# Altium footprint library MainFPs.PcbLib: 215 footprints (part 8 of 14)
Each footprint in its own frame and in the unit in brackets; x right, y up, seen from the top. Pads: shape width x height; smd on the part's side, far side on the other; paste and mask are expansions set on the pad; w line width, h text height; cw(c..) or ccw(c..) is an arc to the next point about the centre after c.
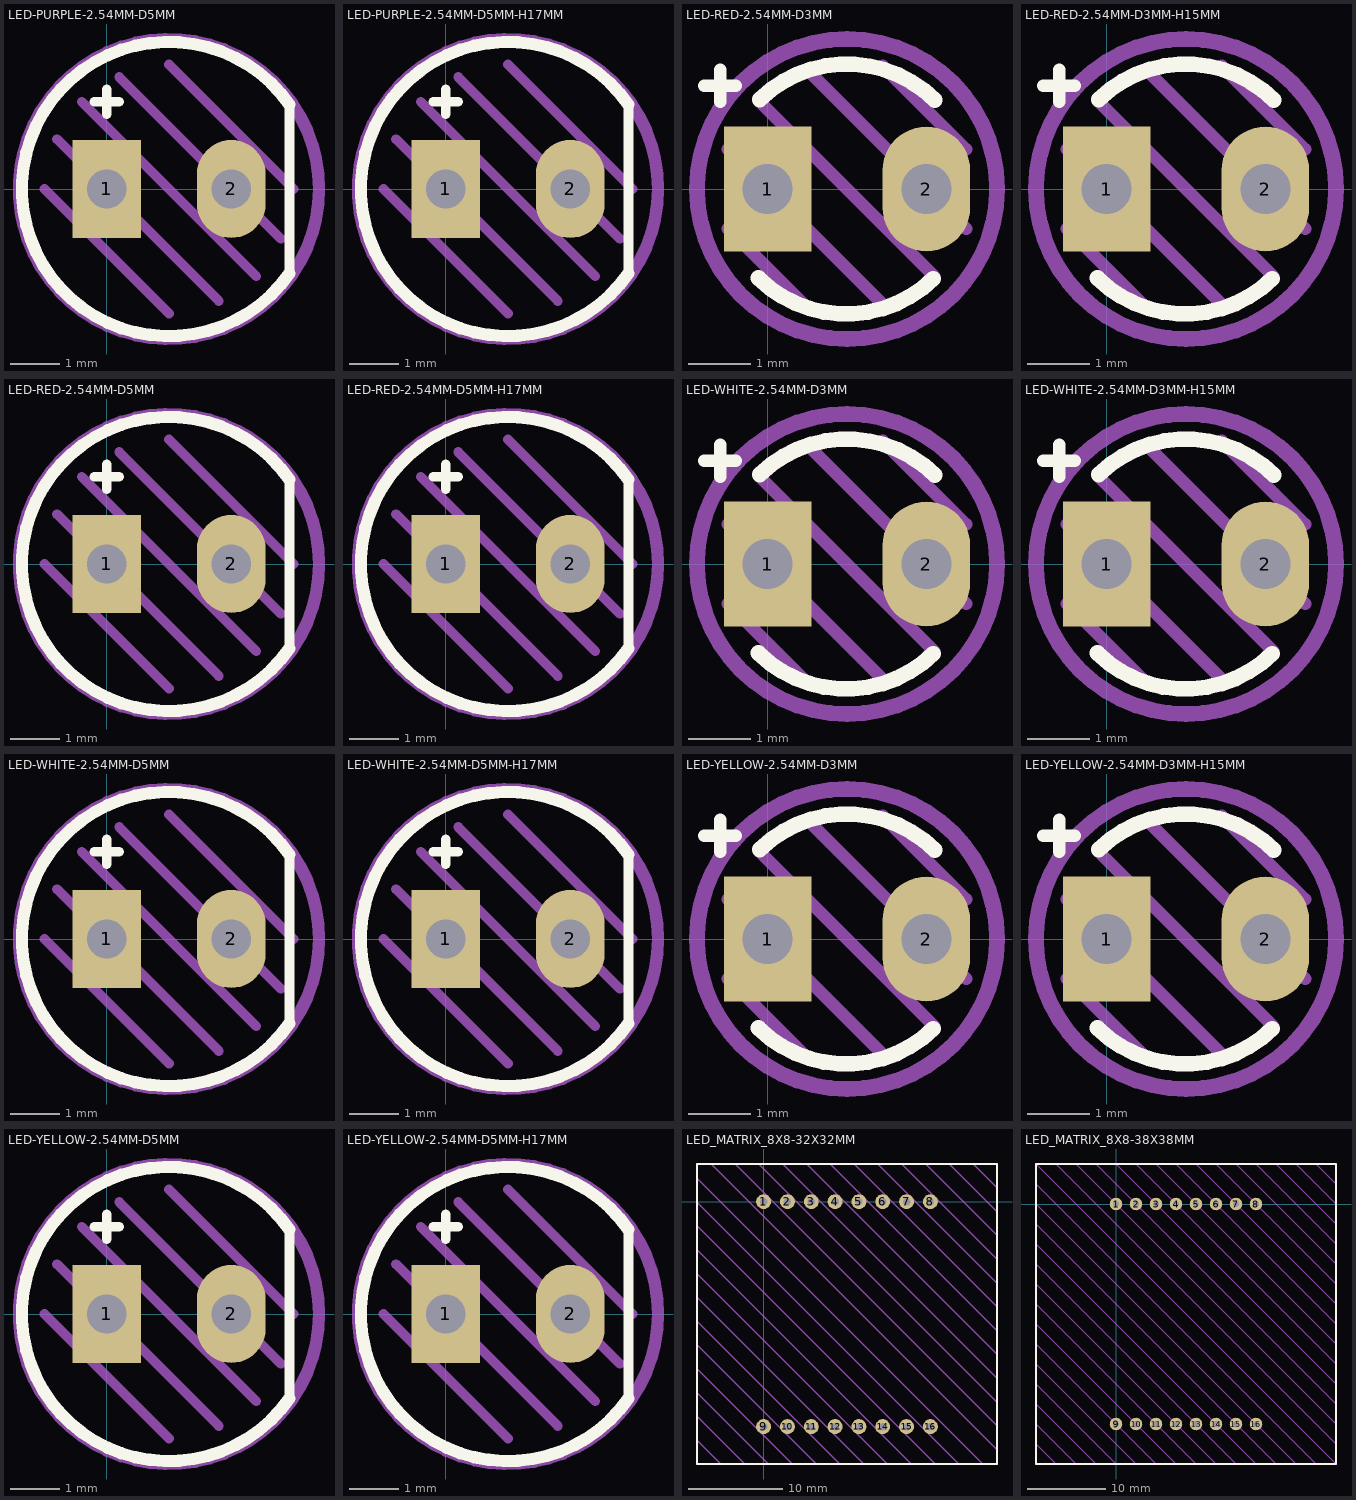
[diagram p7: the footprints below, top view; thin cyan lines are the x and y axes]

## LED-PURPLE-2.54MM-D5MM [mm]
pads (2):
  rect 1.4x2 hole 0.8: 1(0,0)
  oval 1.4x2 hole 0.8: 2(2.54,0)
Top Overlay:
  lines w0.2: -0.254,1.778 -0.127,1.778 0.127,1.778 0.254,1.778 ; 0,1.524 0,2.032 ; 3.727,-1.721 3.727,1.721
  lines w0.25: 3.727,-1.721 cw(c1.27,0) 3.727,1.721
Top Draw:
  circle w0.25: c1.27,0 r3.059
  lines w0.2: -1.27,0 1.27,-2.54 ; -1.016,1.016 2.286,-2.286 ; -0.508,1.778 3.048,-1.778 ; 0.254,2.286 3.556,-1.016 ; 1.27,2.54 3.81,0
Top Info:
  text "'.Comment'" at -1.578,-4.372 h1
3D body: height 1, standoff 0, extent -1.63,-2.909 3.77,2.909
3D body: height 7.7, standoff 2.7, extent -1.236,-2.5 3.764,2.5
3D body: height 5.2, standoff 1, extent -1.23,-2.5 3.77,2.5
3D body: height 0.5, standoff -3, extent 2.29,-0.25 2.79,0.25
3D body: height 0.5, standoff -3, extent -0.25,-0.25 0.25,0.25

## LED-PURPLE-2.54MM-D5MM-H17MM [mm]
pads (2):
  rect 1.4x2 hole 0.8: 1(0,0)
  oval 1.4x2 hole 0.8: 2(2.54,0)
Top Overlay:
  lines w0.2: -0.254,1.778 -0.127,1.778 0.127,1.778 0.254,1.778 ; 0,1.524 0,2.032 ; 3.727,-1.721 3.727,1.721
  lines w0.25: 3.727,-1.721 cw(c1.27,0) 3.727,1.721
Top Draw:
  circle w0.25: c1.27,0 r3.059
  lines w0.2: -1.27,0 1.27,-2.54 ; -1.016,1.016 2.286,-2.286 ; -0.508,1.778 3.048,-1.778 ; 0.254,2.286 3.556,-1.016 ; 1.27,2.54 3.81,0
Top Info:
  text "'.Comment'" at -1.578,-4.372 h1
3D body: height 10.3, standoff 9.3, extent -1.63,-2.909 3.77,2.909
3D body: height 17, standoff 12, extent -1.236,-2.5 3.764,2.5
3D body: height 14.5, standoff 10.3, extent -1.23,-2.5 3.77,2.5
3D body: height 7.8, standoff 7, extent 2.24,-0.25 2.84,0.25
3D body: height 7.8, standoff 7, extent -0.3,-0.25 0.3,0.25
3D body: height 10, standoff -3, extent -0.25,-0.25 0.25,0.25
3D body: height 10, standoff -3, extent 2.29,-0.25 2.79,0.25

## LED-RED-2.54MM-D3MM [mm]
pads (2):
  rect 1.4x2 hole 0.8: 1(0,0)
  oval 1.4x2 hole 0.8: 2(2.54,0)
Top Overlay:
  lines w0.2: -1.016,1.651 -0.508,1.651 ; -0.762,1.397 -0.762,1.905
  lines w0.25: -0.147,-1.425 ccw(c1.257,-0.001) 2.653,-1.434 ; -0.125,1.433 cw(c1.27,0) 2.674,1.424
Top Draw:
  circle w0.25: c1.27,0 r2.4
  lines w0.2: -0.635,-0.635 0.635,-1.905 ; -0.635,0.635 1.905,-1.905 ; -0.127,1.397 2.667,-1.397 ; 0.635,1.905 3.175,-0.635 ; 1.841,1.968 3.175,0.635
Top Info:
  text "'.Comment'" at -1.705,-3.61 h1
3D body: height 1, standoff 0, extent -0.63,-1.91 2.77,1.91
3D body: height 0.5, standoff -1.78, extent -0.25,-0.25 0.25,0.25
3D body: height 5.3, standoff 2.3, extent -0.236,-1.5 2.764,1.5
3D body: height 3.7, standoff 1, extent -0.23,-1.5 2.77,1.5
3D body: height 0.5, standoff -1.78, extent 2.29,-0.25 2.79,0.25

## LED-RED-2.54MM-D3MM-H15MM [mm]
pads (2):
  rect 1.4x2 hole 0.8: 1(0,0)
  oval 1.4x2 hole 0.8: 2(2.54,0)
Top Overlay:
  lines w0.2: -1.016,1.651 -0.508,1.651 ; -0.762,1.397 -0.762,1.905
  lines w0.25: -0.147,-1.425 ccw(c1.257,-0.001) 2.653,-1.434 ; -0.125,1.433 cw(c1.27,0) 2.674,1.424
Top Draw:
  circle w0.25: c1.27,0 r2.4
  lines w0.2: -0.635,-0.635 0.635,-1.905 ; -0.635,0.635 1.905,-1.905 ; -0.127,1.397 2.667,-1.397 ; 0.635,1.905 3.175,-0.635 ; 1.841,1.968 3.175,0.635
Top Info:
  text "'.Comment'" at -1.705,-3.61 h1
3D body: height 7.8, standoff 7, extent 2.24,-0.25 2.84,0.25
3D body: height 7.8, standoff 7, extent -0.3,-0.25 0.3,0.25
3D body: height 10.7, standoff 9.7, extent -0.63,-1.91 2.77,1.91
3D body: height 10, standoff -3, extent -0.25,-0.25 0.25,0.25
3D body: height 15, standoff 12, extent -0.236,-1.5 2.764,1.5
3D body: height 13.4, standoff 10.7, extent -0.23,-1.5 2.77,1.5
3D body: height 10, standoff -3, extent 2.29,-0.25 2.79,0.25

## LED-RED-2.54MM-D5MM [mm]
pads (2):
  rect 1.4x2 hole 0.8: 1(0,0)
  oval 1.4x2 hole 0.8: 2(2.54,0)
Top Overlay:
  lines w0.2: -0.254,1.778 -0.127,1.778 0.127,1.778 0.254,1.778 ; 0,1.524 0,2.032 ; 3.727,-1.721 3.727,1.721
  lines w0.25: 3.727,-1.721 cw(c1.27,0) 3.727,1.721
Top Draw:
  circle w0.25: c1.27,0 r3.059
  lines w0.2: -1.27,0 1.27,-2.54 ; -1.016,1.016 2.286,-2.286 ; -0.508,1.778 3.048,-1.778 ; 0.254,2.286 3.556,-1.016 ; 1.27,2.54 3.81,0
Top Info:
  text "'.Comment'" at -1.578,-4.372 h1
3D body: height 0.5, standoff -3, extent -0.25,-0.25 0.25,0.25
3D body: height 0.5, standoff -3, extent 2.29,-0.25 2.79,0.25
3D body: height 5.2, standoff 1, extent -1.23,-2.5 3.77,2.5
3D body: height 7.7, standoff 2.7, extent -1.236,-2.5 3.764,2.5
3D body: height 1, standoff 0, extent -1.63,-2.909 3.77,2.909

## LED-RED-2.54MM-D5MM-H17MM [mm]
pads (2):
  rect 1.4x2 hole 0.8: 1(0,0)
  oval 1.4x2 hole 0.8: 2(2.54,0)
Top Overlay:
  lines w0.2: -0.254,1.778 -0.127,1.778 0.127,1.778 0.254,1.778 ; 0,1.524 0,2.032 ; 3.727,-1.721 3.727,1.721
  lines w0.25: 3.727,-1.721 cw(c1.27,0) 3.727,1.721
Top Draw:
  circle w0.25: c1.27,0 r3.059
  lines w0.2: -1.27,0 1.27,-2.54 ; -1.016,1.016 2.286,-2.286 ; -0.508,1.778 3.048,-1.778 ; 0.254,2.286 3.556,-1.016 ; 1.27,2.54 3.81,0
Top Info:
  text "'.Comment'" at -1.578,-4.372 h1
3D body: height 10, standoff -3, extent 2.29,-0.25 2.79,0.25
3D body: height 10, standoff -3, extent -0.25,-0.25 0.25,0.25
3D body: height 7.8, standoff 7, extent -0.3,-0.25 0.3,0.25
3D body: height 7.8, standoff 7, extent 2.24,-0.25 2.84,0.25
3D body: height 14.5, standoff 10.3, extent -1.23,-2.5 3.77,2.5
3D body: height 17, standoff 12, extent -1.236,-2.5 3.764,2.5
3D body: height 10.3, standoff 9.3, extent -1.63,-2.909 3.77,2.909

## LED-WHITE-2.54MM-D3MM [mm]
pads (2):
  rect 1.4x2 hole 0.8: 1(0,0)
  oval 1.4x2 hole 0.8: 2(2.54,0)
Top Overlay:
  lines w0.2: -1.016,1.651 -0.508,1.651 ; -0.762,1.397 -0.762,1.905
  lines w0.25: -0.147,-1.425 ccw(c1.257,-0.001) 2.653,-1.434 ; -0.125,1.433 cw(c1.27,0) 2.674,1.424
Top Draw:
  circle w0.25: c1.27,0 r2.4
  lines w0.2: -0.635,-0.635 0.635,-1.905 ; -0.635,0.635 1.905,-1.905 ; -0.127,1.397 2.667,-1.397 ; 0.635,1.905 3.175,-0.635 ; 1.841,1.968 3.175,0.635
Top Info:
  text "'.Comment'" at -1.705,-3.61 h1
3D body: height 1, standoff 0, extent -0.63,-1.91 2.77,1.91
3D body: height 0.5, standoff -1.78, extent -0.25,-0.25 0.25,0.25
3D body: height 5.3, standoff 2.3, extent -0.236,-1.5 2.764,1.5
3D body: height 3.7, standoff 1, extent -0.23,-1.5 2.77,1.5
3D body: height 0.5, standoff -1.78, extent 2.29,-0.25 2.79,0.25

## LED-WHITE-2.54MM-D3MM-H15MM [mm]
pads (2):
  rect 1.4x2 hole 0.8: 1(0,0)
  oval 1.4x2 hole 0.8: 2(2.54,0)
Top Overlay:
  lines w0.2: -1.016,1.651 -0.508,1.651 ; -0.762,1.397 -0.762,1.905
  lines w0.25: -0.147,-1.425 ccw(c1.257,-0.001) 2.653,-1.434 ; -0.125,1.433 cw(c1.27,0) 2.674,1.424
Top Draw:
  circle w0.25: c1.27,0 r2.4
  lines w0.2: -0.635,-0.635 0.635,-1.905 ; -0.635,0.635 1.905,-1.905 ; -0.127,1.397 2.667,-1.397 ; 0.635,1.905 3.175,-0.635 ; 1.841,1.968 3.175,0.635
Top Info:
  text "'.Comment'" at -1.705,-3.61 h1
3D body: height 10, standoff -3, extent 2.29,-0.25 2.79,0.25
3D body: height 13.4, standoff 10.7, extent -0.23,-1.5 2.77,1.5
3D body: height 15, standoff 12, extent -0.236,-1.5 2.764,1.5
3D body: height 10, standoff -3, extent -0.25,-0.25 0.25,0.25
3D body: height 10.7, standoff 9.7, extent -0.63,-1.91 2.77,1.91
3D body: height 7.8, standoff 7, extent -0.3,-0.25 0.3,0.25
3D body: height 7.8, standoff 7, extent 2.24,-0.25 2.84,0.25

## LED-WHITE-2.54MM-D5MM [mm]
pads (2):
  rect 1.4x2 hole 0.8: 1(0,0)
  oval 1.4x2 hole 0.8: 2(2.54,0)
Top Overlay:
  lines w0.2: -0.254,1.778 -0.127,1.778 0.127,1.778 0.254,1.778 ; 0,1.524 0,2.032 ; 3.727,-1.721 3.727,1.721
  lines w0.25: 3.727,-1.721 cw(c1.27,0) 3.727,1.721
Top Draw:
  circle w0.25: c1.27,0 r3.059
  lines w0.2: -1.27,0 1.27,-2.54 ; -1.016,1.016 2.286,-2.286 ; -0.508,1.778 3.048,-1.778 ; 0.254,2.286 3.556,-1.016 ; 1.27,2.54 3.81,0
Top Info:
  text "'.Comment'" at -1.578,-4.372 h1
3D body: height 1, standoff 0, extent -1.63,-2.909 3.77,2.909
3D body: height 7.7, standoff 2.7, extent -1.236,-2.5 3.764,2.5
3D body: height 5.2, standoff 1, extent -1.23,-2.5 3.77,2.5
3D body: height 0.5, standoff -3, extent 2.29,-0.25 2.79,0.25
3D body: height 0.5, standoff -3, extent -0.25,-0.25 0.25,0.25

## LED-WHITE-2.54MM-D5MM-H17MM [mm]
pads (2):
  rect 1.4x2 hole 0.8: 1(0,0)
  oval 1.4x2 hole 0.8: 2(2.54,0)
Top Overlay:
  lines w0.2: -0.254,1.778 -0.127,1.778 0.127,1.778 0.254,1.778 ; 0,1.524 0,2.032 ; 3.727,-1.721 3.727,1.721
  lines w0.25: 3.727,-1.721 cw(c1.27,0) 3.727,1.721
Top Draw:
  circle w0.25: c1.27,0 r3.059
  lines w0.2: -1.27,0 1.27,-2.54 ; -1.016,1.016 2.286,-2.286 ; -0.508,1.778 3.048,-1.778 ; 0.254,2.286 3.556,-1.016 ; 1.27,2.54 3.81,0
Top Info:
  text "'.Comment'" at -1.578,-4.372 h1
3D body: height 10, standoff -3, extent 2.29,-0.25 2.79,0.25
3D body: height 10, standoff -3, extent -0.25,-0.25 0.25,0.25
3D body: height 7.8, standoff 7, extent -0.3,-0.25 0.3,0.25
3D body: height 7.8, standoff 7, extent 2.24,-0.25 2.84,0.25
3D body: height 14.5, standoff 10.3, extent -1.23,-2.5 3.77,2.5
3D body: height 17, standoff 12, extent -1.236,-2.5 3.764,2.5
3D body: height 10.3, standoff 9.3, extent -1.63,-2.909 3.77,2.909

## LED-YELLOW-2.54MM-D3MM [mm]
pads (2):
  rect 1.4x2 hole 0.8: 1(0,0)
  oval 1.4x2 hole 0.8: 2(2.54,0)
Top Overlay:
  lines w0.2: -1.016,1.651 -0.508,1.651 ; -0.762,1.397 -0.762,1.905
  lines w0.25: -0.147,-1.425 ccw(c1.257,-0.001) 2.653,-1.434 ; -0.125,1.433 cw(c1.27,0) 2.674,1.424
Top Draw:
  circle w0.25: c1.27,0 r2.4
  lines w0.2: -0.635,-0.635 0.635,-1.905 ; -0.635,0.635 1.905,-1.905 ; -0.127,1.397 2.667,-1.397 ; 0.635,1.905 3.175,-0.635 ; 1.841,1.968 3.175,0.635
Top Info:
  text "'.Comment'" at -1.705,-3.61 h1
3D body: height 0.5, standoff -1.78, extent 2.29,-0.25 2.79,0.25
3D body: height 3.7, standoff 1, extent -0.23,-1.5 2.77,1.5
3D body: height 5.3, standoff 2.3, extent -0.236,-1.5 2.764,1.5
3D body: height 0.5, standoff -1.78, extent -0.25,-0.25 0.25,0.25
3D body: height 1, standoff 0, extent -0.63,-1.91 2.77,1.91

## LED-YELLOW-2.54MM-D3MM-H15MM [mm]
pads (2):
  rect 1.4x2 hole 0.8: 1(0,0)
  oval 1.4x2 hole 0.8: 2(2.54,0)
Top Overlay:
  lines w0.2: -1.016,1.651 -0.508,1.651 ; -0.762,1.397 -0.762,1.905
  lines w0.25: -0.147,-1.425 ccw(c1.257,-0.001) 2.653,-1.434 ; -0.125,1.433 cw(c1.27,0) 2.674,1.424
Top Draw:
  circle w0.25: c1.27,0 r2.4
  lines w0.2: -0.635,-0.635 0.635,-1.905 ; -0.635,0.635 1.905,-1.905 ; -0.127,1.397 2.667,-1.397 ; 0.635,1.905 3.175,-0.635 ; 1.841,1.968 3.175,0.635
Top Info:
  text "'.Comment'" at -1.705,-3.61 h1
3D body: height 7.8, standoff 7, extent 2.24,-0.25 2.84,0.25
3D body: height 7.8, standoff 7, extent -0.3,-0.25 0.3,0.25
3D body: height 10.7, standoff 9.7, extent -0.63,-1.91 2.77,1.91
3D body: height 10, standoff -3, extent -0.25,-0.25 0.25,0.25
3D body: height 15, standoff 12, extent -0.236,-1.5 2.764,1.5
3D body: height 13.4, standoff 10.7, extent -0.23,-1.5 2.77,1.5
3D body: height 10, standoff -3, extent 2.29,-0.25 2.79,0.25

## LED-YELLOW-2.54MM-D5MM [mm]
pads (2):
  rect 1.4x2 hole 0.8: 1(0,0)
  oval 1.4x2 hole 0.8: 2(2.54,0)
Top Overlay:
  lines w0.2: -0.254,1.778 -0.127,1.778 0.127,1.778 0.254,1.778 ; 0,1.524 0,2.032 ; 3.727,-1.721 3.727,1.721
  lines w0.25: 3.727,-1.721 cw(c1.27,0) 3.727,1.721
Top Draw:
  circle w0.25: c1.27,0 r3.059
  lines w0.2: -1.27,0 1.27,-2.54 ; -1.016,1.016 2.286,-2.286 ; -0.508,1.778 3.048,-1.778 ; 0.254,2.286 3.556,-1.016 ; 1.27,2.54 3.81,0
Top Info:
  text "'.Comment'" at -1.578,-4.372 h1
3D body: height 0.5, standoff -3, extent -0.25,-0.25 0.25,0.25
3D body: height 0.5, standoff -3, extent 2.29,-0.25 2.79,0.25
3D body: height 5.2, standoff 1, extent -1.23,-2.5 3.77,2.5
3D body: height 7.7, standoff 2.7, extent -1.236,-2.5 3.764,2.5
3D body: height 1, standoff 0, extent -1.63,-2.909 3.77,2.909

## LED-YELLOW-2.54MM-D5MM-H17MM [mm]
pads (2):
  rect 1.4x2 hole 0.8: 1(0,0)
  oval 1.4x2 hole 0.8: 2(2.54,0)
Top Overlay:
  lines w0.2: -0.254,1.778 -0.127,1.778 0.127,1.778 0.254,1.778 ; 0,1.524 0,2.032 ; 3.727,-1.721 3.727,1.721
  lines w0.25: 3.727,-1.721 cw(c1.27,0) 3.727,1.721
Top Draw:
  circle w0.25: c1.27,0 r3.059
  lines w0.2: -1.27,0 1.27,-2.54 ; -1.016,1.016 2.286,-2.286 ; -0.508,1.778 3.048,-1.778 ; 0.254,2.286 3.556,-1.016 ; 1.27,2.54 3.81,0
Top Info:
  text "'.Comment'" at -1.578,-4.372 h1
3D body: height 10.3, standoff 9.3, extent -1.63,-2.909 3.77,2.909
3D body: height 17, standoff 12, extent -1.236,-2.5 3.764,2.5
3D body: height 14.5, standoff 10.3, extent -1.23,-2.5 3.77,2.5
3D body: height 7.8, standoff 7, extent 2.24,-0.25 2.84,0.25
3D body: height 7.8, standoff 7, extent -0.3,-0.25 0.3,0.25
3D body: height 10, standoff -3, extent -0.25,-0.25 0.25,0.25
3D body: height 10, standoff -3, extent 2.29,-0.25 2.79,0.25

## LED_MATRIX_8X8-32X32MM [mm]
pads (16):
  round 1.6 hole 0.8: 1(0,0) 2(2.54,0) 3(5.08,0) 4(7.62,0) 5(10.16,0) 6(12.7,0) 7(15.24,0) 8(17.78,0) 9(0,-24) 10(2.54,-24) 11(5.08,-24) 12(7.62,-24) 13(10.16,-24) 14(12.7,-24) 15(15.24,-24) 16(17.78,-24)
Top Overlay:
  lines w0.2: -7.112,-27.982 -7.112,4.022 24.892,4.022 24.892,-27.982 -7.112,-27.982
Top Draw:
  lines w0.2: -7.112,-25.442 -4.572,-27.982 ; -7.112,-22.902 -2.032,-27.982 ; -7.112,-20.362 0.508,-27.982 ; -7.112,-17.822 3.048,-27.982 ; -7.112,-15.282 5.588,-27.982 ; -7.112,-12.742 8.128,-27.982 ; -7.112,-10.202 10.668,-27.982 ; -7.112,-7.662 13.208,-27.982 ; -7.112,-5.122 15.748,-27.982 ; -7.112,-2.582 18.288,-27.982 ; -7.112,-0.042 20.828,-27.982 ; -7.112,2.498 23.368,-27.982 ; -5.588,4.022 24.892,-26.458 ; -3.048,4.022 24.892,-23.918 ; -0.508,4.022 24.892,-21.378 ; 2.032,4.022 24.892,-18.838 ; 4.572,4.022 24.892,-16.298 ; 7.112,4.022 24.892,-13.758 ; 9.652,4.022 24.892,-11.218 ; 12.192,4.022 24.892,-8.678 ; 14.732,4.022 24.892,-6.138 ; 17.272,4.022 24.892,-3.598 ; 19.812,4.022 24.892,-1.058 ; 22.352,4.022 24.892,1.482 ; -7.112,-27.982 -7.112,4.022 24.892,4.022 24.892,-27.982 -7.112,-27.982
Top Info:
  text "'.Comment'" at -1.732,-31.557 h2.5
3D body "LED_Matrix8x8.step": height 7.3, standoff -2, extent -7.08,-27.98 24.92,4.02

## LED_MATRIX_8X8-38X38MM [mm]
pads (16):
  round 1.6 hole 0.8: 1(0,0) 2(2.54,0) 3(5.08,0) 4(7.62,0) 5(10.16,0) 6(12.7,0) 7(15.24,0) 8(17.78,0) 9(0,-27.94) 10(2.54,-27.94) 11(5.08,-27.94) 12(7.62,-27.94) 13(10.16,-27.94) 14(12.7,-27.94) 15(15.24,-27.94) 16(17.78,-27.94)
Top Overlay:
  lines w0.2: -10.16,-33.02 27.94,-33.02 27.94,5.08 -10.16,5.08 -10.16,-33.02
Top Draw:
  lines w0.2: -10.16,-30.48 -7.62,-33.02 ; -10.16,-27.94 -5.08,-33.02 ; -10.16,-25.4 -2.54,-33.02 ; -10.16,-22.86 0,-33.02 ; -10.16,-20.32 2.54,-33.02 ; -10.16,-17.78 5.08,-33.02 ; -10.16,-15.24 7.62,-33.02 ; -10.16,-12.7 10.16,-33.02 ; -10.16,-10.16 12.7,-33.02 ; -10.16,-7.62 15.24,-33.02 ; -10.16,-5.08 17.78,-33.02 ; -10.16,-2.54 20.32,-33.02 ; -10.16,0 22.86,-33.02 ; -10.16,2.54 25.4,-33.02 ; -7.62,5.08 27.94,-30.48 ; -5.08,5.08 27.94,-27.94 ; -2.54,5.08 27.94,-25.4 ; 0,5.08 27.94,-22.86 ; 2.54,5.08 27.94,-20.32 ; 5.08,5.08 27.94,-17.78 ; 7.62,5.08 27.94,-15.24 ; 10.16,5.08 27.94,-12.7 ; 12.7,5.08 27.94,-10.16 ; 15.24,5.08 27.94,-7.62 ; 17.78,5.08 27.94,-5.08 ; 20.32,5.08 27.94,-2.54 ; 22.86,5.08 27.94,0 ; 25.4,5.08 27.94,2.54 ; -10.16,5.08 27.94,5.08 27.94,-33.02 ; -10.16,5.08 -10.16,-33.02 27.94,-33.02 ; -10.16,5.08 27.94,-33.02
Top Info:
  text "'.Comment'" at -1.732,-36.637 h2.5